# Altium integrated library CDxx.IntLib: 163 symbols
Pins are listed as number, name and electrical type; pins without a type are passive.

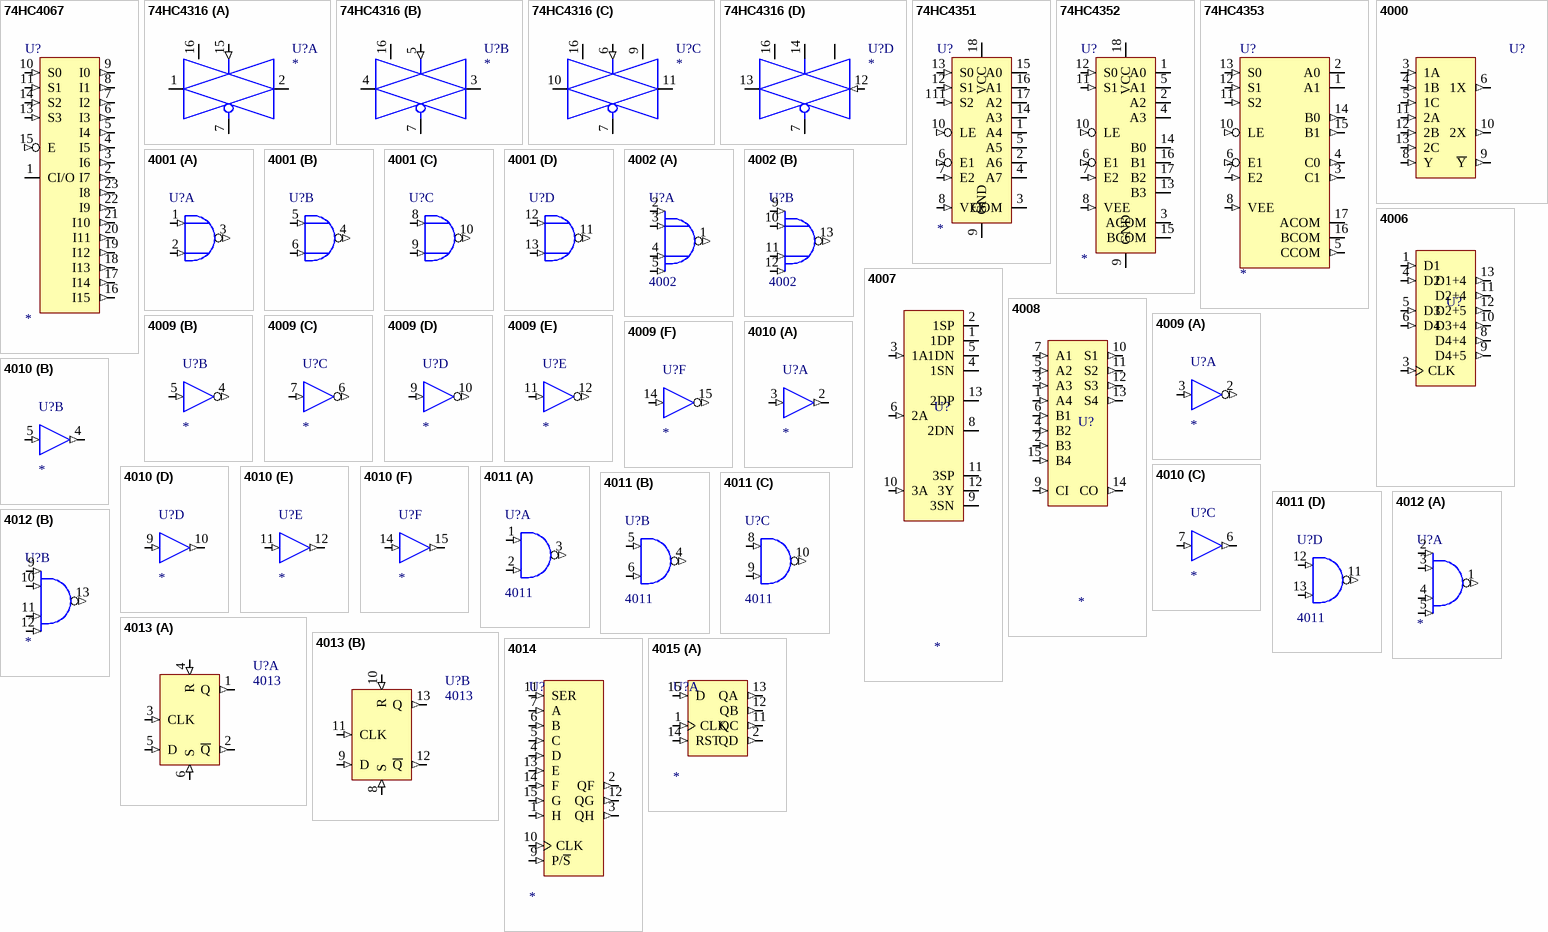
[diagram p0: symbols 74HC4067 to 4015]

## 74HC4067
designator U?
footprint DIL24-300a
pins: 1 CI/O (io), 2 I7 (out), 3 I6 (out), 4 I5 (out), 5 I4 (out), 6 I3 (out), 7 I2 (out), 8 I1 (out), 9 I0 (out), 10 S0 (in), 11 S1 (in), 12 GND (power) hidden to GND, 13 S3 (in), 14 S2 (in), 15 E (in), 16 I15 (out), 17 I14 (out), 18 I13 (out), 19 I12 (out), 20 I11 (out), 21 I10 (out), 22 I9 (out), 23 I8 (out), 24 VCC (power) hidden to VCC

## 74HC4316
designator U?
footprint DIL16-300a
pins on every part: 7 E (power) hidden to GND, 16 Vcc (power) hidden to VCC
part A pins: 1 I/O (io), 2 O/I (io), 15 CTL (in)
part B pins: 3 O/I (io), 4 I/O (io), 5 CTL (in)
part C pins: 6 CTL (in), 9 O/I (io) hidden to Vee, 10 I/O (io), 11 I/O
part D pins: 8 Gnd (power) hidden to Gnd, 12 O/I (in), 13 I/O (io), 14 CTL (io)

## 74HC4351
designator U?
footprint DIL18-300a
pins: 1 A4 (io), 2 A6 (io), 3 COM (io), 4 A7 (io), 5 A5 (io), 6 E1 (in), 7 E2 (in), 8 VEE (in), 9 GND (power) hidden to GND, 10 LE (in), 12 S1 (in), 13 S0 (in), 14 A3 (io), 15 A0 (io), 16 A1 (io), 17 A2 (io), 18 VCC (power) hidden to VCC, 111 S2 (in)

## 74HC4352
designator U?
footprint DIL1-300a (Footprint not found)
pins: 1 A0 (io), 2 A2 (io), 3 ACOM (io), 4 A3 (io), 5 A1 (io), 6 E1 (in), 7 E2 (in), 8 VEE (in), 9 GND (power) hidden to GND, 10 LE (in), 11 S1 (in), 12 S0 (in), 13 B3 (io), 14 B0 (io), 15 BCOM (io), 16 B1 (io), 17 B2 (io), 18 VCC (power) hidden to VCC

## 74HC4353
designator U?
footprint DIL18-300a
pins: 1 A1 (io), 2 A0 (io), 3 C1 (out), 4 C0 (out), 5 CCOM (out), 6 E1 (in), 7 E2 (in), 8 VEE (in), 9 GND (power) hidden to GND, 10 LE (in), 11 S2 (in), 12 S1 (in), 13 S0 (in), 14 B0 (out), 15 B1 (out), 16 BCOM (io), 17 ACOM (io), 18 VCC (power) hidden to VCC

## 4000
designator U?
footprint DIL14-300
pins: 3 1A (in), 4 1B (in), 5 1C (in), 6 1X (out), 7 Vss (power) hidden to Vss, 8 Y (in), 9 ~{Y} (out), 10 2X (out), 11 2A (in), 12 2B (in), 13 2C (in), 14 VDD (power) hidden to Vdd

## 4001
designator U?
footprint DIL14-300
pins on every part: 7 VSS (power) hidden to VSS, 14 VDD (power) hidden to VDD
part A pins: 1 I0 (in), 2 I1 (in), 3 O (out)
part B pins: 4 O (out), 5 I0 (in), 6 I1 (in)
part C pins: 8 I0 (in), 9 I1 (in), 10 O (out)
part D pins: 11 O (out), 12 I0 (in), 13 I1 (in)
1 alternate drawing of the same symbol

## 4002
designator U?
Price: 0.17
footprint DIL14-300
pins on every part: 7 VSS (power) hidden to VSS, 14 VDD (power) hidden to VDD
part A pins: 1 O (out), 2 I0 (in), 3 I1 (in), 4 I2 (in), 5 I3 (in)
part B pins: 9 I0 (in), 10 I1 (in), 11 I2 (in), 12 I3 (in), 13 O (out)
1 alternate drawing of the same symbol

## 4006
designator U?
footprint DIL14-300
pins: 1 D1 (in), 3 CLK (in), 4 D2 (in), 5 D3 (in), 6 D4 (in), 7 VSS (power) hidden to VSS, 8 D4+4 (out), 9 D4+5 (out), 10 D3+4 (out), 11 D2+4 (out), 12 D2+5 (out), 13 D1+4 (out), 14 VDD (power) hidden to VDD

## 4007
designator U?
footprint DIL14-300
pins: 1 1DP (oc), 2 1SP (oc), 3 1A (in), 4 1SN (oc), 5 1DN (oc), 6 2A (in), 7 VSS (power) hidden to Vss, 8 2DN (io), 9 3SN (io), 10 3A (in), 11 3SP (io), 12 3Y (io), 13 2DP (io), 14 VDD (power) hidden to Vdd

## 4008
designator U?
footprint DIL16-300a
pins: 1 A4 (in), 2 B3 (in), 3 A3 (in), 4 B2 (in), 5 A2 (in), 6 B1 (in), 7 A1 (in), 8 VSS (power) hidden to VSS, 9 CI (in), 10 S1 (out), 11 S2 (out), 12 S3 (out), 13 S4 (out), 14 CO (out), 15 B4 (in), 16 VDD (power) hidden to VDD

## 4009
designator U?
footprint DIL14-300
pins on every part: 1 VDD (power) hidden to VDD, 8 VSS (power) hidden to VSS
part A pins: 2 O (out), 3 I (in)
part B pins: 4 O (out), 5 I (in)
part C pins: 6 O (out), 7 I (in)
part D pins: 9 I (in), 10 O (out)
part E pins: 11 I (in), 12 O (out)
part F pins: 14 I (in), 15 O (out)
1 alternate drawing of the same symbol

## 4010
designator U?
footprint DIL14-300
pins on every part: 1 VDD (power) hidden to VDD, 8 VSS (power) hidden to VSS
part A pins: 2 O (out), 3 I (in)
part B pins: 4 O (out), 5 I (in)
part C pins: 6 O (out), 7 I (in)
part D pins: 9 I (in), 10 O (out)
part E pins: 11 I (in), 12 O (out)
part F pins: 14 I (in), 15 O (out)
1 alternate drawing of the same symbol

## 4011
designator U?
footprint DIL14-300
pins on every part: 7 VSS (power) hidden to VSS, 14 VDD (power) hidden to VDD
part A pins: 1 I0 (in), 2 I1 (in), 3 O (out)
part B pins: 4 O (out), 5 I0 (in), 6 I1 (in)
part C pins: 8 I0 (in), 9 I1 (in), 10 O (out)
part D pins: 11 O (out), 12 I0 (in), 13 I1 (in)
1 alternate drawing of the same symbol

## 4012
designator U?
footprint DIL14-300
pins on every part: 7 VSS (power) hidden to VSS, 14 VDD (power) hidden to VDD
part A pins: 1 O (out), 2 I0 (in), 3 I1 (in), 4 I2 (in), 5 I3 (in)
part B pins: 9 I0 (in), 10 I1 (in), 11 I2 (in), 12 I3 (in), 13 O (out)
1 alternate drawing of the same symbol

## 4013
designator U?
Price: 0.32
footprint DIL14-300
footprint SO14-150
pins on every part: 7 VSS (power) hidden to VSS, 14 VDD (power) hidden to VDD
part A pins: 1 Q (out), 2 ~{Q} (out), 3 CLK (in), 4 R (in), 5 D (in), 6 S (in)
part B pins: 8 S (in), 9 D (in), 10 R (in), 11 CLK (in), 12 ~{Q} (out), 13 Q (out)

## 4014
designator U?
footprint DIL16-300a
pins: 1 H (in), 2 QF (out), 3 QH (out), 4 D (in), 5 C (in), 6 B (in), 7 A (in), 8 VSS (power) hidden to VSS, 9 P/~{S} (in), 10 CLK (in), 11 SER (in), 12 QG (out), 13 E (in), 14 F (in), 15 G (in), 16 VDD (power) hidden to VDD

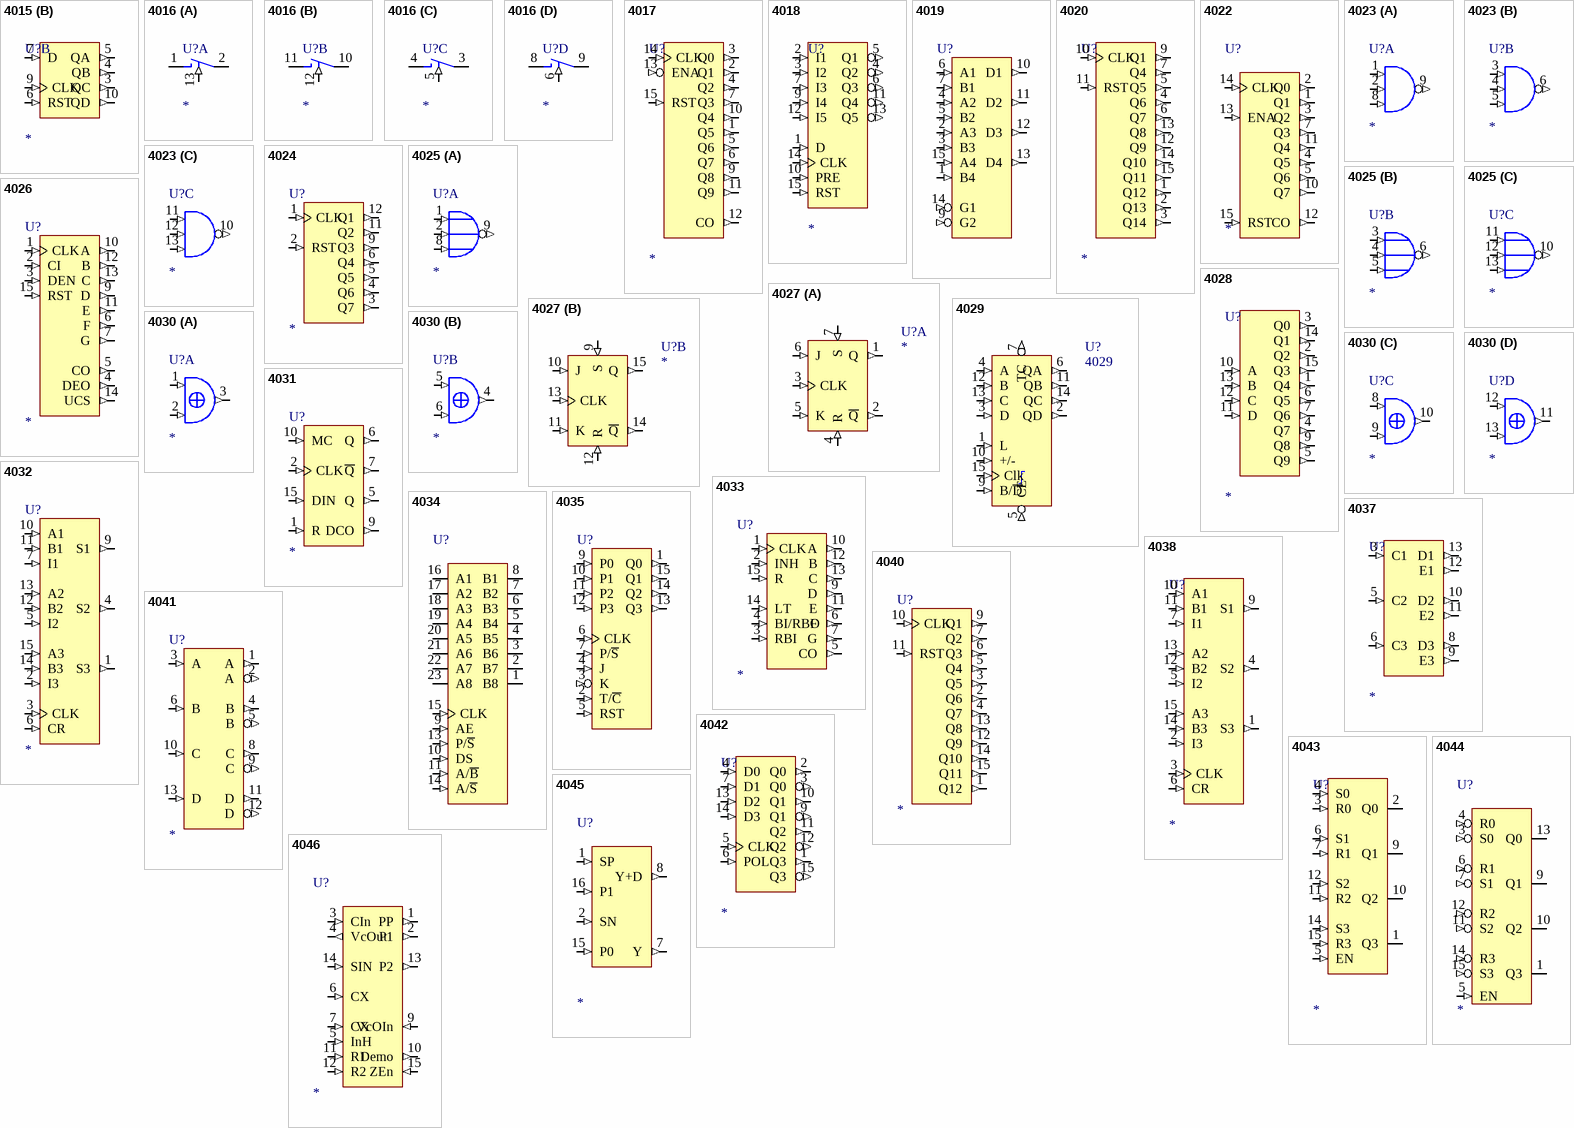
[diagram p1: symbols 4015 to 4046]

## 4015
designator U?
footprint DIL16-300a
pins on every part: 8 VSS (power) hidden to VSS, 16 VDD (power) hidden to VDD
part A pins: 1 CLK (in), 2 QD (out), 11 QC (out), 12 QB (out), 13 QA (out), 14 RST (in), 15 D (in)
part B pins: 3 QC (out), 4 QB (out), 5 QA (out), 6 RST (in), 7 D (in), 9 CLK (in), 10 QD (out)

## 4016
designator U?
footprint DIL14-300
pins on every part: 7 VSS (power) hidden to VSS, 14 VDD (power) hidden to VDD
part A pins: 1 A, 2 B, 13 C (in)
part B pins: 10 B, 11 A, 12 C (in)
part C pins: 3 B, 4 A, 5 C (in)
part D pins: 6 C (in), 8 A, 9 B

## 4017
designator U?
footprint DIL16-300a
pins: 1 Q5 (out), 2 Q1 (out), 3 Q0 (out), 4 Q2 (out), 5 Q6 (out), 6 Q7 (out), 7 Q3 (out), 8 VSS (power) hidden to VSS, 9 Q8 (out), 10 Q4 (out), 11 Q9 (out), 12 CO (out), 13 ENA (in), 14 CLK (in), 15 RST (in), 16 VDD (power) hidden to VDD

## 4018
designator U?
footprint DIL16-300
pins: 1 D (in), 2 I1 (in), 3 I2 (in), 4 Q2 (out), 5 Q1 (out), 6 Q3 (out), 7 I3 (in), 8 VSS (power) hidden to VSS, 9 I4 (in), 10 PRE (in), 11 Q4 (out), 12 I5 (in), 13 Q5 (out), 14 CLK (in), 15 RST (in), 16 VDD (power) hidden to VDD

## 4019
designator U?
footprint DIL16-300a
pins: 1 B4 (in), 2 A3 (in), 3 B3 (in), 4 A2 (in), 5 B2 (in), 6 A1 (in), 7 B1 (in), 8 VSS (power) hidden to VSS, 9 G2 (in), 10 D1 (out), 11 D2 (out), 12 D3 (out), 13 D4 (out), 14 G1 (in), 15 A4 (in), 16 VDD (power) hidden to VDD

## 4020
designator U?
footprint DIL16-300a
pins: 1 Q12 (out), 2 Q13 (out), 3 Q14 (out), 4 Q6 (out), 5 Q5 (out), 6 Q7 (out), 7 Q4 (out), 8 VSS (power) hidden to VSS, 9 Q1 (out), 10 CLK (in), 11 RST (in), 12 Q9 (out), 13 Q8 (out), 14 Q10 (out), 15 Q11 (out), 16 VDD (power) hidden to VDD

## 4022
designator U?
footprint DIL16-300a
pins: 1 Q1 (out), 2 Q0 (out), 3 Q2 (out), 4 Q5 (out), 5 Q6 (out), 7 Q3 (out), 8 VSS (power) hidden to VSS, 10 Q7 (out), 11 Q4 (out), 12 CO (out), 13 ENA (in), 14 CLK (in), 15 RST (in), 16 VDD (power) hidden to VDD

## 4023
designator U?
footprint DIL14-300
pins on every part: 7 VSS (power) hidden to VSS, 14 VDD (power) hidden to VDD
part A pins: 1 I0 (in), 2 I1 (in), 8 I2 (in), 9 O (out)
part B pins: 3 I0 (in), 4 I1 (in), 5 I2 (in), 6 O (out)
part C pins: 10 O (out), 11 I0 (in), 12 I1 (in), 13 I2 (in)
1 alternate drawing of the same symbol

## 4024
designator U?
footprint DIL14-300
pins: 1 CLK (in), 2 RST (in), 3 Q7 (out), 4 Q6 (out), 5 Q5 (out), 6 Q4 (out), 7 VSS (power) hidden to VSS, 9 Q3 (out), 11 Q2 (out), 12 Q1 (out), 14 VDD (power) hidden to VDD

## 4025
designator U?
footprint DIL14-300
pins on every part: 7 VSS (power) hidden to VSS, 14 VDD (power) hidden to VDD
part A pins: 1 I0 (in), 2 I1 (in), 8 I2 (in), 9 O (out)
part B pins: 3 I0 (in), 4 I1 (in), 5 I2 (in), 6 O (out)
part C pins: 10 O (out), 11 I0 (in), 12 I1 (in), 13 I2 (in)
1 alternate drawing of the same symbol

## 4026
designator U?
footprint DIL16-300a
pins: 1 CLK (in), 2 CI (in), 3 DEN (in), 4 DEO (out), 5 CO (out), 6 F (out), 7 G (out), 8 VSS (power) hidden to VSS, 9 D (out), 10 A (out), 11 E (out), 12 B (out), 13 C (out), 14 UCS (out), 15 RST (in), 16 VDD (power) hidden to VDD

## 4027
designator U?
footprint DIL14-300
pins on every part: 8 VSS (power) hidden to VSS, 16 VDD (power) hidden to VDD
part A pins: 1 Q (out), 2 ~{Q} (out), 3 CLK (in), 4 R (in), 5 K (in), 6 J (in), 7 S (in)
part B pins: 9 S (in), 10 J (in), 11 K (in), 12 R (in), 13 CLK (in), 14 ~{Q} (out), 15 Q (out)

## 4028
designator U?
footprint DIL16-300a
pins: 1 Q4 (out), 2 Q2 (out), 3 Q0 (out), 4 Q7 (out), 5 Q9 (out), 6 Q5 (out), 7 Q6 (out), 8 VSS (power) hidden to VSS, 9 Q8 (out), 10 A (in), 11 D (in), 12 C (in), 13 B (in), 14 Q1 (out), 15 Q3 (out), 16 VDD (power) hidden to VDD

## 4029
designator U?
Price: 0.5; Value: 4029
footprint DIL16-300a
pins: 1 L (in), 2 QD (out), 3 D (in), 4 A (in), 5 CE (in), 6 QA (out), 7 TC (out), 8 VSS (power) hidden to VSS, 9 B/~{D} (in), 10 +/- (in), 11 QB (out), 12 B (in), 13 C (in), 14 QC (out), 15 Clk (in), 16 VDD (power) hidden to VDD
1 alternate drawing of the same symbol

## 4030
designator U?
footprint DIL14-300
pins on every part: 7 VSS (power) hidden to VSS, 14 VDD (power) hidden to VDD
part A pins: 1 I0 (in), 2 I1 (in), 3 O (out)
part B pins: 4 O (out), 5 I0 (in), 6 I1 (in)
part C pins: 8 I0 (in), 9 I1 (in), 10 O (out)
part D pins: 11 O (out), 12 I0 (in), 13 I1 (in)

## 4031
designator U?
footprint DIL16-300a
pins: 1 R (in), 2 CLK (in), 5 Q (out), 6 Q (out), 7 ~{Q} (out), 8 VSS (power) hidden to VSS, 9 DCO (out), 10 MC (in), 15 DIN (in), 16 VDD (power) hidden to VDD

## 4032
designator U?
footprint DIL16-300a
pins: 1 S3 (out), 2 I3 (in), 3 CLK (in), 4 S2 (out), 5 I2 (in), 6 CR (in), 7 I1 (in), 8 VSS (power) hidden to VSS, 9 S1 (out), 10 A1 (in), 11 B1 (in), 12 B2 (in), 13 A2 (in), 14 B3 (in), 15 A3 (in), 16 VDD (power) hidden to VDD

## 4033
designator U?
footprint DIL16-300a
pins: 1 CLK (in), 2 INH (in), 3 RBI (in), 4 BI/RBO (in), 5 CO (out), 6 F (out), 7 G (out), 8 VSS (power) hidden to VSS, 9 D (out), 10 A (out), 11 E (out), 12 B (out), 13 C (out), 14 LT (in), 15 R (in), 16 VDD (power) hidden to VDD

## 4034
designator U?
footprint DIL24-600a
pins: 1 B8 (io), 2 B7 (io), 3 B6 (io), 4 B5 (io), 5 B4 (io), 6 B3 (io), 7 B2 (io), 8 B1 (io), 9 AE (in), 10 DS (in), 11 A/~{B} (in), 12 VSS (power) hidden to VSS, 13 P/~{S} (in), 14 A/~{S} (in), 15 CLK (in), 16 A1 (io), 17 A2 (io), 18 A3 (io), 19 A4 (io), 20 A5 (io), 21 A6 (io), 22 A7 (io), 23 A8 (io), 24 VDD (power) hidden to VDD

## 4035
designator U?
footprint DIL16-300a
pins: 1 Q0 (out), 2 T/~{C} (in), 3 K (in), 4 J (in), 5 RST (in), 6 CLK (in), 7 P/~{S} (in), 8 VSS (power) hidden to VSS, 9 P0 (in), 10 P1 (in), 11 P2 (in), 12 P3 (in), 13 Q3 (out), 14 Q2 (out), 15 Q1 (out), 16 VDD (power) hidden to VDD

## 4037
designator U?
footprint DIL14-300
pins: 3 C1 (in), 5 C2 (in), 6 C3 (in), 7 VSS (power) hidden to VSS, 8 D3 (out), 9 E3 (out), 10 D2 (out), 11 E2 (out), 12 E1 (out), 13 D1 (out), 14 VDD (power) hidden to VDD

## 4038
designator U?
footprint DIL16-300a
pins: 1 S3 (out), 2 I3 (in), 3 CLK (in), 4 S2 (out), 5 I2 (in), 6 CR (in), 7 I1 (in), 8 VSS (power) hidden to VSS, 9 S1 (out), 10 A1 (in), 11 B1 (in), 12 B2 (in), 13 A2 (in), 14 B3 (in), 15 A3 (in), 16 VDD (power) hidden to VDD

## 4040
designator U?
footprint DIL14-300a
pins: 1 Q12 (out), 2 Q6 (out), 3 Q5 (out), 4 Q7 (out), 5 Q4 (out), 6 Q3 (out), 7 Q2 (out), 8 VSS (power) hidden to VSS, 9 Q1 (out), 10 CLK (in), 11 RST (in), 12 Q9 (out), 13 Q8 (out), 14 Q10 (out), 15 Q11 (out), 16 VDD (power) hidden to VDD

## 4041
designator U?
footprint DIL14-300
pins: 1 A (out), 2 A (out), 3 A (in), 4 B (out), 5 B (out), 6 B (in), 7 VSS (power) hidden to Vss, 8 C (out), 9 C (out), 10 C (in), 11 D (out), 12 D (out), 13 D (in), 14 Vcc (power) hidden to Vcc

## 4042
designator U?
footprint DIL16-300a
pins: 1 Q3 (out), 2 Q0 (out), 3 Q0 (out), 4 D0 (in), 5 CLK (in), 6 POL (in), 7 D1 (in), 8 VSS (power) hidden to VSS, 9 Q1 (out), 10 Q1 (out), 11 Q2 (out), 12 Q2 (out), 13 D2 (in), 14 D3 (in), 15 Q3 (out), 16 VDD (power) hidden to VDD

## 4043
designator U?
footprint DIL16-300a
pins: 1 Q3 (hiz), 2 Q0 (hiz), 3 R0 (in), 4 S0 (in), 5 EN (in), 6 S1 (in), 7 R1 (in), 8 VSS (power) hidden to VSS, 9 Q1 (hiz), 10 Q2 (hiz), 11 R2 (in), 12 S2 (in), 14 S3 (in), 15 R3 (in), 16 VDD (power) hidden to VDD

## 4044
designator U?
footprint DIL16-300a
pins: 1 Q3 (hiz), 3 S0 (in), 4 R0 (in), 5 EN (in), 6 R1 (in), 7 S1 (in), 8 VSS (power) hidden to VSS, 9 Q1 (hiz), 10 Q2 (hiz), 11 S2 (in), 12 R2 (in), 13 Q0 (hiz), 14 R3 (in), 15 S3 (in), 16 VDD (power) hidden to VDD

## 4045
designator U?
footprint DIL16-300a
pins: 1 SP (in), 2 SN (in), 3 VDD (power) hidden to VDD, 7 Y (out), 8 Y+D (out), 14 VSS (power) hidden to VSS, 15 P0 (in), 16 P1 (in)

## 4046
designator U?
footprint DIL16-300a
pins: 1 PP (out), 2 P1 (out), 3 CIn (in), 4 VcOut (out), 5 InH (in), 6 CX (in), 7 CX (in), 8 VSS (power) hidden to VSS, 9 VcOIn (in), 10 Demo (out), 11 R1 (in), 12 R2 (in), 13 P2 (out), 14 SIN (in), 15 ZEn (in), 16 VDD (power) hidden to VDD

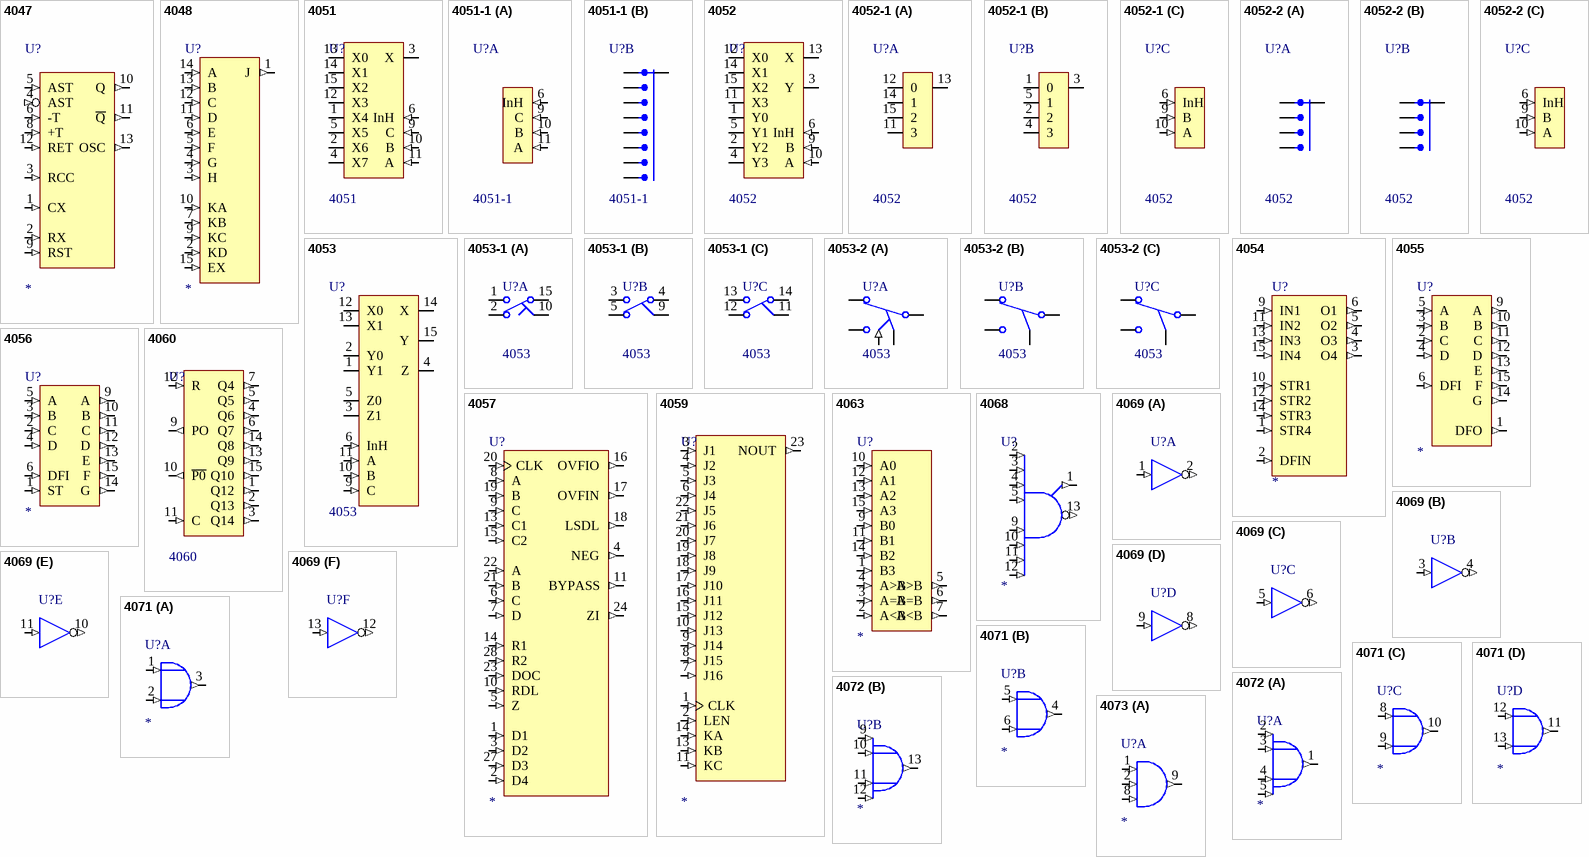
[diagram p2: symbols 4047 to 4073]

## 4047
designator U?
footprint DIL14-300
pins: 1 CX (in), 2 RX (in), 3 RCC (in), 4 AST (in), 5 AST (in), 6 -T (in), 7 VSS (power) hidden to VSS, 8 +T (in), 9 RST (in), 10 Q (out), 11 ~{Q} (out), 12 RET (in), 13 OSC (out), 14 VDD (power) hidden to VDD

## 4048
designator U?
footprint DIL16-300a
pins: 1 J (out), 2 KD (in), 3 H (in), 4 G (in), 5 F (in), 6 E (in), 7 KB (in), 8 VSS (power) hidden to VSS, 9 KC (in), 10 KA (in), 11 D (in), 12 C (in), 13 B (in), 14 A (in), 15 EX (in), 16 VDD (power) hidden to VDD

## 4051
designator U?
Price: 0.3
footprint DIL16-300a
pins: 1 X4 (io), 2 X6 (io), 3 X (io), 4 X7 (io), 5 X5 (io), 6 InH (in), 7 Vee (power) hidden to Vee, 8 Vss (power) hidden to Vss, 9 C (in), 10 B (in), 11 A (in), 12 X3 (io), 13 X0 (io), 14 X1 (io), 15 X2 (io), 16 Vdd (power) hidden to Vdd

## 4051-1
designator U?
Price: 0.3
footprint DIL16-300a
part A pins: 6 InH (in), 7 Vee (power) hidden to Vee, 8 Vss (power) hidden to Vss, 9 C (in), 10 B (in), 11 A (in), 16 Vdd (power) hidden to Vdd
part B pins: 1 X4 (io), 2 X6 (io), 3 X (io), 4 X7 (io), 5 X5 (io), 12 X3 (io), 13 X0 (io), 14 X1 (io), 15 X2 (io)

## 4052
designator U?
Price: 0.28
footprint DIL16-300a
pins: 1 Y0 (io), 2 Y2 (io), 3 Y (io), 4 Y3 (io), 5 Y1 (io), 6 InH (in), 7 Vee (power) hidden to Vee, 8 Vss (power) hidden to Vss, 9 B (in), 10 A (in), 11 X3 (io), 12 X0 (io), 13 X (io), 14 X1 (io), 15 X2 (io), 16 Vdd (power) hidden to Vdd

## 4052-1
designator U?, comment 4052
Price: 0.28
footprint DIL16-300a
footprint SO16-150
part A pins: 11 3 (io), 12 0 (io), 13 X (io), 14 1 (io), 15 2 (io)
part B pins: 1 0 (io), 2 (io), 3 (io), 4 3 (io), 5 1 (io)
part C pins: 6 InH (in), 7 Vee (power) hidden to Vee, 8 Vss (power) hidden to Vss, 9 B (in), 10 A (in), 16 Vdd (power) hidden to Vdd

## 4052-2
designator U?, comment 4052
Price: 0.28
footprint DIL16-300a
footprint SO16-150
part A pins: 11 3 (io), 12 0 (io), 13 X (io), 14 1 (io), 15 2 (io)
part B pins: 1 0 (io), 2 (io), 3 (io), 4 3 (io), 5 1 (io)
part C pins: 6 InH (in), 7 Vee (power) hidden to Vee, 8 Vss (power) hidden to Vss, 9 B (in), 10 A (in), 16 Vdd (power) hidden to Vdd

## 4053
designator U?
Price: 0.28
footprint DIL16-300a
footprint SO16-150
pins: 1 Y1 (io), 2 Y0 (io), 3 Z1 (io), 4 Z (io), 5 Z0 (io), 6 InH (in), 7 Vee (power) hidden to Vee, 8 Vss (power) hidden to Vss, 9 C (in), 10 B (in), 11 A (in), 12 X0 (io), 13 X1 (io), 14 X (io), 15 Y (io), 16 Vdd (power) hidden to Vdd

## 4053-1
designator U?, comment 4053
Price: 0.27; Price: 0.28
footprint DIL16-300a
footprint SO16-150
part A pins: 1 a1, 2 a0, 6 I (in), 10 A, 15 a
part B pins: 3 b1, 4 b, 5 b0, 9 B
part C pins: 7 VEE hidden to VEE, 8 VSS (power) hidden to VSS, 11 C, 12 c0, 13 c1, 14 c, 16 VDD (power) hidden to VDD

## 4053-2
designator U?, comment 4053
Price: 0.28
footprint DIL16-300a
footprint SO16-150
part A pins: 1 a1, 2 a2, 6 I (in), 10 A, 15 a
part B pins: 3 b1, 4 b, 5 b0, 9 B
part C pins: 7 VEE hidden to VEE, 8 VSS (power) hidden to VSS, 11 C, 12 c0, 13 c1, 14 c, 16 VDD (power) hidden to VDD

## 4054
designator U?
footprint DIL16-300a
pins: 1 STR4 (in), 2 DFIN (in), 3 O4 (out), 4 O3 (out), 5 O2 (out), 6 O1 (out), 7 VEE (power) hidden to VEE, 8 VSS (power) hidden to VSS, 9 IN1 (in), 10 STR1 (in), 11 IN2 (in), 12 STR2 (in), 13 IN3 (in), 14 STR3 (in), 15 IN4 (in), 16 VDD (power) hidden to VDD

## 4055
designator U?
footprint DIL16-300a
pins: 1 DFO (out), 2 C (in), 3 B (in), 4 D (in), 5 A (in), 6 DFI (in), 7 VEE (power) hidden to VEE, 8 VSS (power) hidden to VSS, 9 A (out), 10 B (out), 11 C (out), 12 D (out), 13 E (out), 14 G (out), 15 F (out), 16 VDD (power) hidden to VDD

## 4056
designator U?
footprint DIL16-300a
pins: 1 ST (in), 2 C (in), 3 B (in), 4 D (in), 5 A (in), 6 DFI (in), 7 VEE (power) hidden to VEE, 8 VSS (power) hidden to VSS, 9 A (out), 10 B (out), 11 C (out), 12 D (out), 13 E (out), 14 G (out), 15 F (out), 16 VDD (power) hidden to VDD

## 4057
designator U?
footprint DIL28-600a
pins: 1 D1 (in), 2 D4 (in), 3 D2 (in), 4 NEG (out), 5 Z (in), 6 C (in), 7 D (in), 8 A (in), 9 C (in), 10 RDL (in), 11 BYPASS (out), 13 C1 (in), 14 R1 (in), 15 C2 (in), 16 OVFIO (out), 17 OVFIN (out), 18 LSDL (out), 19 B (in), 20 CLK (in), 21 B (in), 22 A (in), 23 DOC (in), 24 ZI (out), 25 VSS (power) hidden to VSS, 26 VDD (power) hidden to VDD, 27 D3 (in), 28 R2 (in)

## 4059
designator U?
footprint DIL24-300a
pins: 1 CLK (in), 2 LEN (in), 3 J1 (in), 4 J2 (in), 5 J3 (in), 6 J4 (in), 7 J16 (in), 8 J15 (in), 9 J14 (in), 10 J13 (in), 11 KC (in), 12 VSS (power) hidden to VSS, 13 KB (in), 14 KA (in), 15 J12 (in), 16 J11 (in), 17 J10 (in), 18 J9 (in), 19 J8 (in), 20 J7 (in), 21 J6 (in), 22 J5 (in), 23 NOUT (out), 24 VDD (power) hidden to VDD

## 4060
designator U?
Price: 0.3
footprint DIL16-300a
pins: 1 Q12 (out), 2 Q13 (out), 3 Q14 (out), 4 Q6 (out), 5 Q5 (out), 6 Q7 (out), 7 Q4 (out), 8 VSS (power) hidden to VSS, 9 PO (out), 10 ~{P0} (out), 11 C (in), 12 R (in), 13 Q9 (out), 14 Q8 (out), 15 Q10 (out), 16 VDD (power) hidden to VDD

## 4063
designator U?
footprint DIL16-300a
pins: 1 B3 (in), 2 A<B (in), 3 A=B (in), 4 A>B (in), 5 A>B (out), 6 A=B (out), 7 A<B (out), 8 VSS (power) hidden to VSS, 9 B0 (in), 10 A0 (in), 11 B1 (in), 12 A1 (in), 13 A2 (in), 14 B2 (in), 15 A3 (in), 16 VDD (power) hidden to VDD

## 4068
designator U?
footprint DIL14-300
pins: 1 K (out), 2 I0 (in), 3 I1 (in), 4 I2 (in), 5 I3 (in), 7 VSS (power) hidden to VSS, 9 I4 (in), 10 I5 (in), 11 I6 (in), 12 I7 (in), 13 J (out), 14 VDD (power) hidden to VDD
1 alternate drawing of the same symbol

## 4069
designator U?
Price: 0.024
footprint DIL14-300
pins on every part: 7 VSS (power) hidden to VSS, 14 VDD (power) hidden to VDD
part A pins: 1 I (in), 2 O (out)
part B pins: 3 I (in), 4 O (out)
part C pins: 5 I (in), 6 O (out)
part D pins: 8 O (out), 9 I (in)
part E pins: 10 O (out), 11 I (in)
part F pins: 12 O (out), 13 I (in)
1 alternate drawing of the same symbol

## 4071
designator U?
footprint DIL14-300
pins on every part: 7 VSS (power) hidden to VSS, 14 VDD (power) hidden to VDD
part A pins: 1 I0 (in), 2 I1 (in), 3 O (out)
part B pins: 4 O (out), 5 I0 (in), 6 I1 (in)
part C pins: 8 I0 (in), 9 I1 (in), 10 O (out)
part D pins: 11 O (out), 12 I0 (in), 13 I1 (in)
1 alternate drawing of the same symbol

## 4072
designator U?
footprint DIL14-300
pins on every part: 7 VSS (power) hidden to VSS, 14 VDD (power) hidden to VDD
part A pins: 1 O (out), 2 I0 (in), 3 I1 (in), 4 I2 (in), 5 I3 (in)
part B pins: 9 I0 (in), 10 I1 (in), 11 I2 (in), 12 I3 (in), 13 O (out)
1 alternate drawing of the same symbol

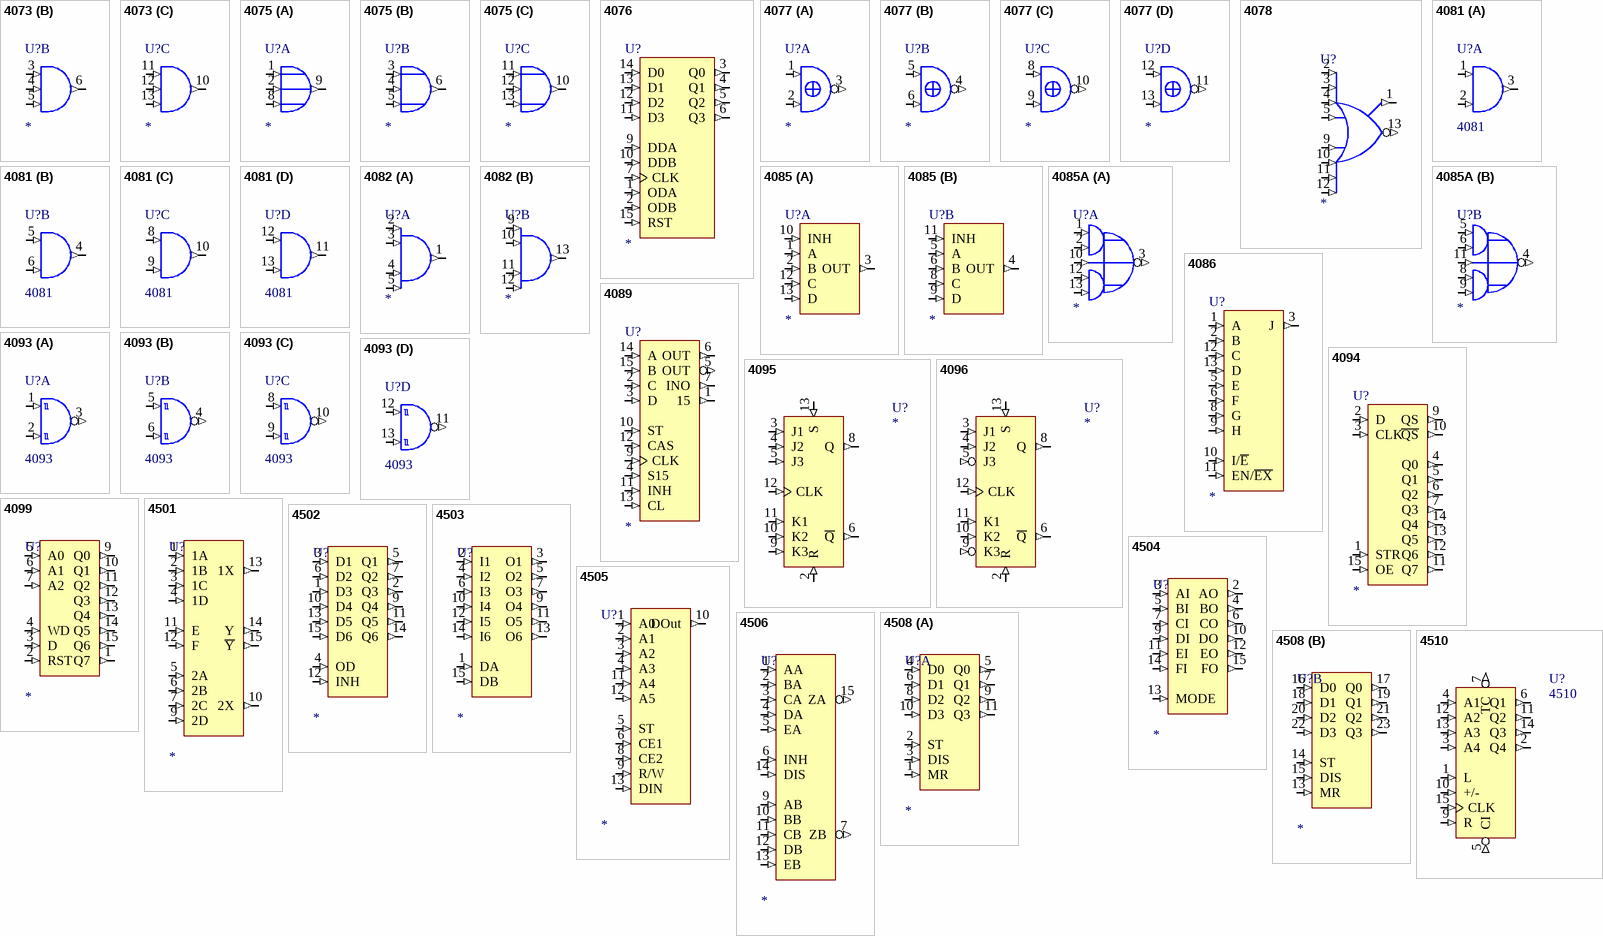
[diagram p3: symbols 4073 to 4510]

## 4073
designator U?
footprint DIL14-300
pins on every part: 7 VSS (power) hidden to VSS, 14 VDD (power) hidden to VDD
part A pins: 1 I0 (in), 2 I1 (in), 8 I2 (in), 9 O (out)
part B pins: 3 I0 (in), 4 I1 (in), 5 I2 (in), 6 O (out)
part C pins: 10 O (out), 11 I0 (in), 12 I1 (in), 13 I2 (in)
1 alternate drawing of the same symbol

## 4075
designator U?
footprint DIL14-300
pins on every part: 7 VSS (power) hidden to VSS, 14 VDD (power) hidden to VDD
part A pins: 1 I0 (in), 2 I1 (in), 8 I2 (in), 9 O (out)
part B pins: 3 I0 (in), 4 I1 (in), 5 I2 (in), 6 O (out)
part C pins: 10 O (out), 11 I0 (in), 12 I1 (in), 13 I2 (in)
1 alternate drawing of the same symbol

## 4076
designator U?
footprint DIL16-300a
pins: 1 ODA (in), 2 ODB (in), 3 Q0 (out), 4 Q1 (out), 5 Q2 (out), 6 Q3 (out), 7 CLK (in), 8 VSS (power) hidden to VSS, 9 DDA (in), 10 DDB (in), 11 D3 (in), 12 D2 (in), 13 D1 (in), 14 D0 (in), 15 RST (in), 16 VDD (power) hidden to VDD

## 4077
designator U?
footprint DIL14-300
pins on every part: 7 VSS (power) hidden to VSS, 14 VDD (power) hidden to VDD
part A pins: 1 I0 (in), 2 I1 (in), 3 O (out)
part B pins: 4 O (out), 5 I0 (in), 6 I1 (in)
part C pins: 8 I0 (in), 9 I1 (in), 10 O (out)
part D pins: 11 O (out), 12 I0 (in), 13 I1 (in)

## 4078
designator U?
footprint DIL14-300
pins: 1 K (out), 2 I0 (in), 3 I1 (in), 4 I2 (in), 5 I3 (in), 7 VSS (power) hidden to VSS, 9 I4 (in), 10 I5 (in), 11 I6 (in), 12 I7 (in), 13 J (out), 14 VDD (power) hidden to VDD
1 alternate drawing of the same symbol

## 4081
designator U?
Price: 0.24
footprint DIL14-300
pins on every part: 7 VSS (power) hidden to VSS, 14 VDD (power) hidden to VDD
part A pins: 1 I0 (in), 2 I1 (in), 3 O (out)
part B pins: 4 O (out), 5 I0 (in), 6 I1 (in)
part C pins: 8 I0 (in), 9 I1 (in), 10 O (out)
part D pins: 11 O (out), 12 I0 (in), 13 I1 (in)
1 alternate drawing of the same symbol

## 4082
designator U?
footprint DIL14-300
pins on every part: 7 VSS (power) hidden to VSS, 14 VDD (power) hidden to VDD
part A pins: 1 O (out), 2 I0 (in), 3 I1 (in), 4 I2 (in), 5 I3 (in)
part B pins: 9 I0 (in), 10 I1 (in), 11 I2 (in), 12 I3 (in), 13 O (out)
1 alternate drawing of the same symbol